# Altium footprint library SAMTEC THD.PcbLib: 161 footprints (part 5 of 12) (continued)
## SAMTEC_SMB5-J-P-H-RA-TH1 [mm] "50 Ohm SMB Right Angle PCB Jack" (continued)
3D body "SAMTEC_SMB5-J-P-H-RA-TH1_Washer.stp": height 8.4, standoff 0.6, extent 9.105,-3.897 10.205,3.897
3D body "SAMTEC_SMB5-J-P-H-RA-TH1_Nut.stp": height 8.17, standoff 0.83, extent 10.205,-3.175 11.705,3.175
3D body "SAMTEC_SMB5-J-P-H-RA-TH1.stp": height 8.13, standoff -2.79, extent -3.68,-3.215 16.77,3.215

## SAMTEC_SQT-110-01-L-D-RA [mm] "20 Contacts - Pitch 2mm - Dual Row Right Angle Socket"
height 4
pads (20):
  round 1.4 hole 0.9: 1(9,-1) 2(9,1) 3(7,-1) 4(7,1) 5(5,-1) 6(5,1) 7(3,-1) 8(3,1) 9(1,-1) 10(1,1) 11(-1,-1) 12(-1,1) 13(-3,-1) 14(-3,1) 15(-5,-1) 16(-5,1) 17(-7,-1) 18(-7,1) 19(-9,-1) 20(-9,1)
Top Overlay:
  circle w0.3: c9.027,-2.378 r0.15
  lines w0.2: -9.25,2 -9.25,2.651 ; -8.75,2 -8.75,2.651 ; -7.25,2 -7.25,2.651 ; -6.75,2 -6.75,2.651 ; -5.25,2 -5.25,2.651 ; -4.75,2 -4.75,2.651 ; -3.25,2 -3.25,2.651 ; -2.75,2 -2.75,2.651 ; -1.25,2 -1.25,2.651 ; -0.75,2 -0.75,2.651 ; 0.75,2 0.75,2.651 ; 1.25,2 1.25,2.651 ; 2.75,2 2.75,2.651 ; 3.25,2 3.25,2.651 ; 4.75,2 4.75,2.651 ; 5.25,2 5.25,2.651 ; 6.75,2 6.75,2.651 ; 7.25,2 7.25,2.651 ; 8.75,2 8.75,2.651 ; 9.25,2 9.25,2.651 ; -10.15,2.27 -10.15,8.62 10.15,8.62 10.15,2.27 9.492,2.27 9.492,2.651 8.508,2.651 8.508,2.27 7.492,2.27 7.492,2.651 6.508,2.651 6.508,2.27 5.492,2.27 5.492,2.651 4.508,2.651 4.508,2.27 3.492,2.27 3.492,2.651 2.508,2.651 2.508,2.27 1.492,2.27 1.492,2.651 0.508,2.651 0.508,2.27 -0.508,2.27 -0.508,2.651 -1.492,2.651 -1.492,2.27 -2.508,2.27 -2.508,2.651 -3.492,2.651 -3.492,2.27 -4.508,2.27 -4.508,2.651 -5.492,2.651 -5.492,2.27 -6.508,2.27 -6.508,2.651 -7.492,2.651 -7.492,2.27 -8.508,2.27 -8.508,2.651 -9.492,2.651 -9.492,2.27 -10.15,2.27
  text "20" at -9.6,3.275 h1.2
  text "1" at 10.3,-1.4 h1.2
Mechanical 8:
  lines w0.1: -9.5,-1 -9,-1 ; -9.5,1 -9,1 ; -9,-1.5 -9,-1 ; -9,-0.5 -9,-1 ; -9,0.5 -9,1 ; -9,1.5 -9,1 ; -8.5,-1 -9,-1 ; -8.5,1 -9,1 ; -7.5,-1 -7,-1 ; -7.5,1 -7,1 ; -7,-1.5 -7,-1 ; -7,-0.5 -7,-1 ; -7,0.5 -7,1 ; -7,1.5 -7,1 ; -6.5,-1 -7,-1 ; -6.5,1 -7,1 ; -5.5,-1 -5,-1 ; -5.5,1 -5,1 ; -5,-1.5 -5,-1 ; -5,-0.5 -5,-1 ; -5,0.5 -5,1 ; -5,1.5 -5,1 ; -4.5,-1 -5,-1 ; -4.5,1 -5,1 ; -3.5,-1 -3,-1 ; -3.5,1 -3,1 ; -3,-1.5 -3,-1 ; -3,-0.5 -3,-1 ; -3,0.5 -3,1 ; -3,1.5 -3,1 ; -2.5,-1 -3,-1 ; -2.5,1 -3,1 ; -1.5,-1 -1,-1 ; -1.5,1 -1,1 ; -1,-1.5 -1,-1 ; -1,-0.5 -1,-1 ; -1,0.5 -1,1 ; -1,1.5 -1,1 ; -0.5,-1 -1,-1 ; -0.5,0 0,0 ; -0.5,1 -1,1 ; 0,-0.5 0,0 ; 0,0.5 0,0 ; 0.5,-1 1,-1 ; 0.5,0 0,0 ; 0.5,1 1,1 ; 1,-1.5 1,-1 ; 1,-0.5 1,-1 ; 1,0.5 1,1 ; 1,1.5 1,1 ; 1.5,-1 1,-1 ; 1.5,1 1,1 ; 2.5,-1 3,-1 ; 2.5,1 3,1 ; 3,-1.5 3,-1 ; 3,-0.5 3,-1 ; 3,0.5 3,1 ; 3,1.5 3,1 ; 3.5,-1 3,-1 ; 3.5,1 3,1 ; 4.5,-1 5,-1 ; 4.5,1 5,1 ; 5,-1.5 5,-1 ; 5,-0.5 5,-1 ; 5,0.5 5,1 ; 5,1.5 5,1 ; 5.5,-1 5,-1 ; 5.5,1 5,1 ; 6.5,-1 7,-1 ; 6.5,1 7,1 ; 7,-1.5 7,-1 ; 7,-0.5 7,-1 ; 7,0.5 7,1 ; 7,1.5 7,1 ; 7.5,-1 7,-1 ; 7.5,1 7,1 ; 8.5,-1 9,-1 ; 8.5,1 9,1 ; 9,-1.5 9,-1 ; 9,-0.5 9,-1 ; 9,0.5 9,1 ; 9,1.5 9,1 ; 9.5,-1 9,-1 ; 9.5,1 9,1
Mechanical 14:
  circle w0.3: c9.027,-2.378 r0.15
  lines w0.1: -9.25,2.651 -9.25,-1.218 -8.75,-1.219 -8.75,2.651 ; -7.25,2.651 -7.25,-1.22 -6.75,-1.22 -6.75,2.651 ; -5.25,2.651 -5.25,-1.221 -4.75,-1.221 -4.75,2.651 ; -3.25,2.651 -3.25,-1.222 -2.75,-1.223 -2.75,2.651 ; -1.25,2.651 -1.25,-1.224 -0.75,-1.224 -0.75,2.651 ; 0.75,2.651 0.75,-1.225 1.25,-1.225 1.25,2.651 ; 2.75,2.651 2.75,-1.226 3.25,-1.227 3.25,2.651 ; 4.75,2.651 4.75,-1.228 5.25,-1.228 5.25,2.651 ; 6.75,2.651 6.75,-1.229 7.25,-1.229 7.25,2.651 ; 8.75,2.651 8.75,-1.23 9.25,-1.23 9.25,2.651 ; -10.15,2.27 -10.15,8.62 10.15,8.62 10.15,2.27 9.492,2.27 9.492,2.651 8.508,2.651 8.508,2.27 7.492,2.27 7.492,2.651 6.508,2.651 6.508,2.27 5.492,2.27 5.492,2.651 4.508,2.651 4.508,2.27 3.492,2.27 3.492,2.651 2.508,2.651 2.508,2.27 1.492,2.27 1.492,2.651 0.508,2.651 0.508,2.27 -0.508,2.27 -0.508,2.651 -1.492,2.651 -1.492,2.27 -2.508,2.27 -2.508,2.651 -3.492,2.651 -3.492,2.27 -4.508,2.27 -4.508,2.651 -5.492,2.651 -5.492,2.27 -6.508,2.27 -6.508,2.651 -7.492,2.651 -7.492,2.27 -8.508,2.27 -8.508,2.651 -9.492,2.651 -9.492,2.27 -10.15,2.27
  text "20" at -9.6,3.275 h1.2
  text "1" at 10.3,-1.4 h1.2
3D body "SAMTEC_SQT-110-01-L-D-RA.stp": height 4, standoff -2.29, extent -10.149,-1.25 10.151,8.62

## SAMTEC_SQT-112-01-L-D-RA [mm] "24 Contacts - Pitch 2mm - Dual Row Right Angle Socket"
height 4
pads (24):
  round 1.4 hole 0.9: 1(11,-1) 2(11,1) 3(9,-1) 4(9,1) 5(7,-1) 6(7,1) 7(5,-1) 8(5,1) 9(3,-1) 10(3,1) 11(1,-1) 12(1,1) 13(-1,-1) 14(-1,1) 15(-3,-1) 16(-3,1) 17(-5,-1) 18(-5,1) 19(-7,-1) 20(-7,1) 21(-9,-1) 22(-9,1) 23(-11,-1) 24(-11,1)
Top Overlay:
  circle w0.3: c11.027,-2.378 r0.15
  lines w0.2: -11.25,2 -11.25,2.651 ; -10.75,2 -10.75,2.651 ; -9.25,2 -9.25,2.651 ; -8.75,2 -8.75,2.651 ; -7.25,2 -7.25,2.651 ; -6.75,2 -6.75,2.651 ; -5.25,2 -5.25,2.651 ; -4.75,2 -4.75,2.651 ; -3.25,2 -3.25,2.651 ; -2.75,2 -2.75,2.651 ; -1.25,2 -1.25,2.651 ; -0.75,2 -0.75,2.651 ; 0.75,2 0.75,2.651 ; 1.25,2 1.25,2.651 ; 2.75,2 2.75,2.651 ; 3.25,2 3.25,2.651 ; 4.75,2 4.75,2.651 ; 5.25,2 5.25,2.651 ; 6.75,2 6.75,2.651 ; 7.25,2 7.25,2.651 ; 8.75,2 8.75,2.651 ; 9.25,2 9.25,2.651 ; 10.75,2 10.75,2.651 ; 11.25,2 11.25,2.651 ; -12.15,2.27 -11.492,2.27 -11.492,2.651 -10.508,2.651 -10.508,2.27 -9.492,2.27 -9.492,2.651 -8.508,2.651 -8.508,2.27 -7.492,2.27 -7.492,2.651 -6.508,2.651 -6.508,2.27 -5.492,2.27 -5.492,2.651 -4.508,2.651 -4.508,2.27 -3.492,2.27 -3.492,2.651 -2.508,2.651 -2.508,2.27 -1.492,2.27 -1.492,2.651 -0.508,2.651 -0.508,2.27 0.508,2.27 0.508,2.651 1.492,2.651 1.492,2.27 2.508,2.27 2.508,2.651 3.492,2.651 3.492,2.27 4.508,2.27 4.508,2.651 5.492,2.651 5.492,2.27 6.508,2.27 6.508,2.651 7.492,2.651 7.492,2.27 8.508,2.27 8.508,2.651 9.492,2.651 9.492,2.27 10.508,2.27 10.508,2.651 11.492,2.651 11.492,2.27 12.15,2.27 12.15,8.62 -12.15,8.62 -12.15,2.27
  text "24" at -11.675,3.225 h1.2
  text "1" at 12.3,-1.4 h1.2
Mechanical 8:
  lines w0.1: -11.5,-1 -11,-1 ; -11.5,1 -11,1 ; -11,-1.5 -11,-1 ; -11,-0.5 -11,-1 ; -11,0.5 -11,1 ; -11,1.5 -11,1 ; -10.5,-1 -11,-1 ; -10.5,1 -11,1 ; -9.5,-1 -9,-1 ; -9.5,1 -9,1 ; -9,-1.5 -9,-1 ; -9,-0.5 -9,-1 ; -9,0.5 -9,1 ; -9,1.5 -9,1 ; -8.5,-1 -9,-1 ; -8.5,1 -9,1 ; -7.5,-1 -7,-1 ; -7.5,1 -7,1 ; -7,-1.5 -7,-1 ; -7,-0.5 -7,-1 ; -7,0.5 -7,1 ; -7,1.5 -7,1 ; -6.5,-1 -7,-1 ; -6.5,1 -7,1 ; -5.5,-1 -5,-1 ; -5.5,1 -5,1 ; -5,-1.5 -5,-1 ; -5,-0.5 -5,-1 ; -5,0.5 -5,1 ; -5,1.5 -5,1 ; -4.5,-1 -5,-1 ; -4.5,1 -5,1 ; -3.5,-1 -3,-1 ; -3.5,1 -3,1 ; -3,-1.5 -3,-1 ; -3,-0.5 -3,-1 ; -3,0.5 -3,1 ; -3,1.5 -3,1 ; -2.5,-1 -3,-1 ; -2.5,1 -3,1 ; -1.5,-1 -1,-1 ; -1.5,1 -1,1 ; -1,-1.5 -1,-1 ; -1,-0.5 -1,-1 ; -1,0.5 -1,1 ; -1,1.5 -1,1 ; -0.5,-1 -1,-1 ; -0.5,0 0,0 ; -0.5,1 -1,1 ; 0,-0.5 0,0 ; 0,0.5 0,0 ; 0.5,-1 1,-1 ; 0.5,0 0,0 ; 0.5,1 1,1 ; 1,-1.5 1,-1 ; 1,-0.5 1,-1 ; 1,0.5 1,1 ; 1,1.5 1,1 ; 1.5,-1 1,-1 ; 1.5,1 1,1 ; 2.5,-1 3,-1 ; 2.5,1 3,1 ; 3,-1.5 3,-1 ; 3,-0.5 3,-1 ; 3,0.5 3,1 ; 3,1.5 3,1 ; 3.5,-1 3,-1 ; 3.5,1 3,1 ; 4.5,-1 5,-1 ; 4.5,1 5,1 ; 5,-1.5 5,-1 ; 5,-0.5 5,-1 ; 5,0.5 5,1 ; 5,1.5 5,1 ; 5.5,-1 5,-1 ; 5.5,1 5,1 ; 6.5,-1 7,-1 ; 6.5,1 7,1 ; 7,-1.5 7,-1 ; 7,-0.5 7,-1 ; 7,0.5 7,1 ; 7,1.5 7,1 ; 7.5,-1 7,-1 ; 7.5,1 7,1 ; 8.5,-1 9,-1 ; 8.5,1 9,1 ; 9,-1.5 9,-1 ; 9,-0.5 9,-1 ; 9,0.5 9,1 ; 9,1.5 9,1 ; 9.5,-1 9,-1 ; 9.5,1 9,1 ; 10.5,-1 11,-1 ; 10.5,1 11,1 ; 11,-1.5 11,-1 ; 11,-0.5 11,-1 ; 11,0.5 11,1 ; 11,1.5 11,1 ; 11.5,-1 11,-1 ; 11.5,1 11,1
Mechanical 14:
  circle w0.3: c11.027,-2.378 r0.15
  lines w0.1: -11.25,2.651 -11.25,-1.218 -10.75,-1.219 -10.75,2.651 ; -9.25,2.651 -9.25,-1.22 -8.75,-1.22 -8.75,2.651 ; -7.25,2.651 -7.25,-1.221 -6.75,-1.221 -6.75,2.651 ; -5.25,2.651 -5.25,-1.222 -4.75,-1.223 -4.75,2.651 ; -3.25,2.651 -3.25,-1.224 -2.75,-1.224 -2.75,2.651 ; -1.25,2.651 -1.25,-1.225 -0.75,-1.225 -0.75,2.651 ; 0.75,2.651 0.75,-1.226 1.25,-1.227 1.25,2.651 ; 2.75,2.651 2.75,-1.228 3.25,-1.228 3.25,2.651 ; 4.75,2.651 4.75,-1.229 5.25,-1.229 5.25,2.651 ; 6.75,2.651 6.75,-1.23 7.25,-1.23 7.25,2.651 ; 8.75,2.651 8.75,-1.23 9.25,-1.23 9.25,2.651 ; 10.75,2.651 10.75,-1.23 11.25,-1.23 11.25,2.651 ; -12.15,2.27 -11.492,2.27 -11.492,2.651 -10.508,2.651 -10.508,2.27 -9.492,2.27 -9.492,2.651 -8.508,2.651 -8.508,2.27 -7.492,2.27 -7.492,2.651 -6.508,2.651 -6.508,2.27 -5.492,2.27 -5.492,2.651 -4.508,2.651 -4.508,2.27 -3.492,2.27 -3.492,2.651 -2.508,2.651 -2.508,2.27 -1.492,2.27 -1.492,2.651 -0.508,2.651 -0.508,2.27 0.508,2.27 0.508,2.651 1.492,2.651 1.492,2.27 2.508,2.27 2.508,2.651 3.492,2.651 3.492,2.27 4.508,2.27 4.508,2.651 5.492,2.651 5.492,2.27 6.508,2.27 6.508,2.651 7.492,2.651 7.492,2.27 8.508,2.27 8.508,2.651 9.492,2.651 9.492,2.27 10.508,2.27 10.508,2.651 11.492,2.651 11.492,2.27 12.15,2.27 12.15,8.62 -12.15,8.62 -12.15,2.27
  text "24" at -11.675,3.225 h1.2
  text "1" at 12.3,-1.4 h1.2
3D body "SAMTEC_SQT-112-01-L-D-RA.stp": height 4, standoff -2.29, extent -12.15,-1.25 12.15,8.62

## SAMTEC_SQT-113-01-L-D-RA [mm] "26 Contacts - Pitch 2mm - Dual Row Right Angle Socket"
height 4
pads (26):
  round 1.4 hole 0.9: 1(12,-1) 2(12,1) 3(10,-1) 4(10,1) 5(8,-1) 6(8,1) 7(6,-1) 8(6,1) 9(4,-1) 10(4,1) 11(2,-1) 12(2,1) 13(0,-1) 14(0,1) 15(-2,-1) 16(-2,1) 17(-4,-1) 18(-4,1) 19(-6,-1) 20(-6,1) 21(-8,-1) 22(-8,1) 23(-10,-1) 24(-10,1) 25(-12,-1) 26(-12,1)
Top Overlay:
  circle w0.3: c12.027,-2.378 r0.15
  lines w0.2: -12.25,2 -12.25,2.651 ; -11.75,2 -11.75,2.651 ; -10.25,2 -10.25,2.651 ; -9.75,2 -9.75,2.651 ; -8.25,2 -8.25,2.651 ; -7.75,2 -7.75,2.651 ; -6.25,2 -6.25,2.651 ; -5.75,2 -5.75,2.651 ; -4.25,2 -4.25,2.651 ; -3.75,2 -3.75,2.651 ; -2.25,2 -2.25,2.651 ; -1.75,2 -1.75,2.651 ; -0.25,2 -0.25,2.651 ; 0.25,2 0.25,2.651 ; 1.75,2 1.75,2.651 ; 2.25,2 2.25,2.651 ; 3.75,2 3.75,2.651 ; 4.25,2 4.25,2.651 ; 5.75,2 5.75,2.651 ; 6.25,2 6.25,2.651 ; 7.75,2 7.75,2.651 ; 8.25,2 8.25,2.651 ; 9.75,2 9.75,2.651 ; 10.25,2 10.25,2.651 ; 11.75,2 11.75,2.651 ; 12.25,2 12.25,2.651 ; -13.15,2.27 -13.15,8.62 13.15,8.62 13.15,2.27 12.492,2.27 12.492,2.651 11.508,2.651 11.508,2.27 10.492,2.27 10.492,2.651 9.508,2.651 9.508,2.27 8.492,2.27 8.492,2.651 7.508,2.651 7.508,2.27 6.492,2.27 6.492,2.651 5.508,2.651 5.508,2.27 4.492,2.27 4.492,2.651 3.508,2.651 3.508,2.27 2.492,2.27 2.492,2.651 1.508,2.651 1.508,2.27 0.492,2.27 0.492,2.651 -0.492,2.651 -0.492,2.27 -1.508,2.27 -1.508,2.651 -2.492,2.651 -2.492,2.27 -3.508,2.27 -3.508,2.651 -4.492,2.651 -4.492,2.27 -5.508,2.27 -5.508,2.651 -6.492,2.651 -6.492,2.27 -7.508,2.27 -7.508,2.651 -8.492,2.651 -8.492,2.27 -9.508,2.27 -9.508,2.651 -10.492,2.651 -10.492,2.27 -11.508,2.27 -11.508,2.651 -12.492,2.651 -12.492,2.27 -13.15,2.27
  text "26" at -12.6,3.225 h1.2
  text "1" at 13.3,-1.4 h1.2
Mechanical 8:
  lines w0.1: -12.5,-1 -12,-1 ; -12.5,1 -12,1 ; -12,-1.5 -12,-1 ; -12,-0.5 -12,-1 ; -12,0.5 -12,1 ; -12,1.5 -12,1 ; -11.5,-1 -12,-1 ; -11.5,1 -12,1 ; -10.5,-1 -10,-1 ; -10.5,1 -10,1 ; -10,-1.5 -10,-1 ; -10,-0.5 -10,-1 ; -10,0.5 -10,1 ; -10,1.5 -10,1 ; -9.5,-1 -10,-1 ; -9.5,1 -10,1 ; -8.5,-1 -8,-1 ; -8.5,1 -8,1 ; -8,-1.5 -8,-1 ; -8,-0.5 -8,-1 ; -8,0.5 -8,1 ; -8,1.5 -8,1 ; -7.5,-1 -8,-1 ; -7.5,1 -8,1 ; -6.5,-1 -6,-1 ; -6.5,1 -6,1 ; -6,-1.5 -6,-1 ; -6,-0.5 -6,-1 ; -6,0.5 -6,1 ; -6,1.5 -6,1 ; -5.5,-1 -6,-1 ; -5.5,1 -6,1 ; -4.5,-1 -4,-1 ; -4.5,1 -4,1 ; -4,-1.5 -4,-1 ; -4,-0.5 -4,-1 ; -4,0.5 -4,1 ; -4,1.5 -4,1 ; -3.5,-1 -4,-1 ; -3.5,1 -4,1 ; -2.5,-1 -2,-1 ; -2.5,1 -2,1 ; -2,-1.5 -2,-1 ; -2,-0.5 -2,-1 ; -2,0.5 -2,1 ; -2,1.5 -2,1 ; -1.5,-1 -2,-1 ; -1.5,1 -2,1 ; -0.5,-1 0,-1 ; -0.5,0 0,0 ; -0.5,1 0,1 ; 0,-1.5 0,-1 ; 0,1.5 0,1 ; 0.5,-1 0,-1 ; 0.5,0 0,0 ; 0.5,1 0,1 ; 1.5,-1 2,-1 ; 1.5,1 2,1 ; 2,-1.5 2,-1 ; 2,-0.5 2,-1 ; 2,0.5 2,1 ; 2,1.5 2,1 ; 2.5,-1 2,-1 ; 2.5,1 2,1 ; 3.5,-1 4,-1 ; 3.5,1 4,1 ; 4,-1.5 4,-1 ; 4,-0.5 4,-1 ; 4,0.5 4,1 ; 4,1.5 4,1 ; 4.5,-1 4,-1 ; 4.5,1 4,1 ; 5.5,-1 6,-1 ; 5.5,1 6,1 ; 6,-1.5 6,-1 ; 6,-0.5 6,-1 ; 6,0.5 6,1 ; 6,1.5 6,1 ; 6.5,-1 6,-1 ; 6.5,1 6,1 ; 7.5,-1 8,-1 ; 7.5,1 8,1 ; 8,-1.5 8,-1 ; 8,-0.5 8,-1 ; 8,0.5 8,1 ; 8,1.5 8,1 ; 8.5,-1 8,-1 ; 8.5,1 8,1 ; 9.5,-1 10,-1 ; 9.5,1 10,1 ; 10,-1.5 10,-1 ; 10,-0.5 10,-1 ; 10,0.5 10,1 ; 10,1.5 10,1 ; 10.5,-1 10,-1 ; 10.5,1 10,1 ; 11.5,-1 12,-1 ; 11.5,1 12,1 ; 12,-1.5 12,-1 ; 12,-0.5 12,-1 ; 12,0.5 12,1 ; 12,1.5 12,1 ; 12.5,-1 12,-1 ; 12.5,1 12,1 ; 0,-1 0,-0.5 0,0 ; 0,0 0,0.5 0,1
Mechanical 14:
  circle w0.3: c12.027,-2.378 r0.15
  lines w0.1: -12.25,2.651 -12.25,-1.218 -11.75,-1.219 -11.75,2.651 ; -10.25,2.651 -10.25,-1.22 -9.75,-1.22 -9.75,2.651 ; -8.25,2.651 -8.25,-1.221 -7.75,-1.221 -7.75,2.651 ; -6.25,2.651 -6.25,-1.222 -5.75,-1.223 -5.75,2.651 ; -4.25,2.651 -4.25,-1.224 -3.75,-1.224 -3.75,2.651 ; -2.25,2.651 -2.25,-1.225 -1.75,-1.225 -1.75,2.651 ; -0.25,2.651 -0.25,-1.226 0.25,-1.227 0.25,2.651 ; 1.75,2.651 1.75,-1.228 2.25,-1.228 2.25,2.651 ; 3.75,2.651 3.75,-1.229 4.25,-1.229 4.25,2.651 ; 5.75,2.651 5.75,-1.23 6.25,-1.23 6.25,2.651 ; 7.75,2.651 7.75,-1.231 8.25,-1.232 8.25,2.651 ; 9.75,2.651 9.75,-1.233 10.25,-1.233 10.25,2.651 ; 11.75,2.651 11.75,-1.234 12.25,-1.234 12.25,2.651 ; -13.15,2.27 -13.15,8.62 13.15,8.62 13.15,2.27 12.492,2.27 12.492,2.651 11.508,2.651 11.508,2.27 10.492,2.27 10.492,2.651 9.508,2.651 9.508,2.27 8.492,2.27 8.492,2.651 7.508,2.651 7.508,2.27 6.492,2.27 6.492,2.651 5.508,2.651 5.508,2.27 4.492,2.27 4.492,2.651 3.508,2.651 3.508,2.27 2.492,2.27 2.492,2.651 1.508,2.651 1.508,2.27 0.492,2.27 0.492,2.651 -0.492,2.651 -0.492,2.27 -1.508,2.27 -1.508,2.651 -2.492,2.651 -2.492,2.27 -3.508,2.27 -3.508,2.651 -4.492,2.651 -4.492,2.27 -5.508,2.27 -5.508,2.651 -6.492,2.651 -6.492,2.27 -7.508,2.27 -7.508,2.651 -8.492,2.651 -8.492,2.27 -9.508,2.27 -9.508,2.651 -10.492,2.651 -10.492,2.27 -11.508,2.27 -11.508,2.651 -12.492,2.651 -12.492,2.27 -13.15,2.27
  text "26" at -12.6,3.225 h1.2
  text "1" at 13.3,-1.4 h1.2
3D body "SAMTEC_SQT-113-01-L-D-RA.stp": height 4, standoff -2.29, extent -13.15,-1.25 13.15,8.62

## SAMTEC_SQT-115-01-L-D-RA [mm] "30 Contacts - Pitch 2mm - Dual Row Right Angle Socket"
height 4
pads (30):
  round 1.4 hole 0.9: 1(14,-1) 2(14,1) 3(12,-1) 4(12,1) 5(10,-1) 6(10,1) 7(8,-1) 8(8,1) 9(6,-1) 10(6,1) 11(4,-1) 12(4,1) 13(2,-1) 14(2,1) 15(0,-1) 16(0,1) 17(-2,-1) 18(-2,1) 19(-4,-1) 20(-4,1) 21(-6,-1) 22(-6,1) 23(-8,-1) 24(-8,1) 25(-10,-1) 26(-10,1) 27(-12,-1) 28(-12,1) 29(-14,-1) 30(-14,1)
Top Overlay:
  circle w0.3: c14.027,-2.378 r0.15
  lines w0.2: -14.25,2 -14.25,2.651 ; -13.75,2 -13.75,2.651 ; -12.25,2 -12.25,2.651 ; -11.75,2 -11.75,2.651 ; -10.25,2 -10.25,2.651 ; -9.75,2 -9.75,2.651 ; -8.25,2 -8.25,2.651 ; -7.75,2 -7.75,2.651 ; -6.25,2 -6.25,2.651 ; -5.75,2 -5.75,2.651 ; -4.25,2 -4.25,2.651 ; -3.75,2 -3.75,2.651 ; -2.25,2 -2.25,2.651 ; -1.75,2 -1.75,2.651 ; -0.25,2 -0.25,2.651 ; 0.25,2 0.25,2.651 ; 1.75,2 1.75,2.651 ; 2.25,2 2.25,2.651 ; 3.75,2 3.75,2.651 ; 4.25,2 4.25,2.651 ; 5.75,2 5.75,2.651 ; 6.25,2 6.25,2.651 ; 7.75,2 7.75,2.651 ; 8.25,2 8.25,2.651 ; 9.75,2 9.75,2.651 ; 10.25,2 10.25,2.651 ; 11.75,2 11.75,2.651 ; 12.25,2 12.25,2.651 ; 13.75,2 13.75,2.651 ; 14.25,2 14.25,2.651 ; -15.15,2.27 -14.492,2.27 -14.492,2.651 -13.508,2.651 -13.508,2.27 -12.492,2.27 -12.492,2.651 -11.508,2.651 -11.508,2.27 -10.492,2.27 -10.492,2.651 -9.508,2.651 -9.508,2.27 -8.492,2.27 -8.492,2.651 -7.508,2.651 -7.508,2.27 -6.492,2.27 -6.492,2.651 -5.508,2.651 -5.508,2.27 -4.492,2.27 -4.492,2.651 -3.508,2.651 -3.508,2.27 -2.492,2.27 -2.492,2.651 -1.508,2.651 -1.508,2.27 -0.492,2.27 -0.492,2.651 0.492,2.651 0.492,2.27 1.508,2.27 1.508,2.651 2.492,2.651 2.492,2.27 3.508,2.27 3.508,2.651 4.492,2.651 4.492,2.27 5.508,2.27 5.508,2.651 6.492,2.651 6.492,2.27 7.508,2.27 7.508,2.651 8.492,2.651 8.492,2.27 9.508,2.27 9.508,2.651 10.492,2.651 10.492,2.27 11.508,2.27 11.508,2.651 12.492,2.651 12.492,2.27 13.508,2.27 13.508,2.651 14.492,2.651 14.492,2.27 15.15,2.27 15.15,8.62 -15.15,8.62 -15.15,2.27
  text "1" at 15.3,-1.4 h1.2
  text "30" at -14.6,3.225 h1.2
Mechanical 8:
  lines w0.1: -14.5,-1 -14,-1 ; -14.5,1 -14,1 ; -14,-1.5 -14,-1 ; -14,-0.5 -14,-1 ; -14,0.5 -14,1 ; -14,1.5 -14,1 ; -13.5,-1 -14,-1 ; -13.5,1 -14,1 ; -12.5,-1 -12,-1 ; -12.5,1 -12,1 ; -12,-1.5 -12,-1 ; -12,-0.5 -12,-1 ; -12,0.5 -12,1 ; -12,1.5 -12,1 ; -11.5,-1 -12,-1 ; -11.5,1 -12,1 ; -10.5,-1 -10,-1 ; -10.5,1 -10,1 ; -10,-1.5 -10,-1 ; -10,-0.5 -10,-1 ; -10,0.5 -10,1 ; -10,1.5 -10,1 ; -9.5,-1 -10,-1 ; -9.5,1 -10,1 ; -8.5,-1 -8,-1 ; -8.5,1 -8,1 ; -8,-1.5 -8,-1 ; -8,-0.5 -8,-1 ; -8,0.5 -8,1 ; -8,1.5 -8,1 ; -7.5,-1 -8,-1 ; -7.5,1 -8,1 ; -6.5,-1 -6,-1 ; -6.5,1 -6,1 ; -6,-1.5 -6,-1 ; -6,-0.5 -6,-1 ; -6,0.5 -6,1 ; -6,1.5 -6,1 ; -5.5,-1 -6,-1 ; -5.5,1 -6,1 ; -4.5,-1 -4,-1 ; -4.5,1 -4,1 ; -4,-1.5 -4,-1 ; -4,-0.5 -4,-1 ; -4,0.5 -4,1 ; -4,1.5 -4,1 ; -3.5,-1 -4,-1 ; -3.5,1 -4,1 ; -2.5,-1 -2,-1 ; -2.5,1 -2,1 ; -2,-1.5 -2,-1 ; -2,-0.5 -2,-1 ; -2,0.5 -2,1 ; -2,1.5 -2,1 ; -1.5,-1 -2,-1 ; -1.5,1 -2,1 ; -0.5,-1 0,-1 ; -0.5,0 0,0 ; -0.5,1 0,1 ; 0,-1.5 0,-1 ; 0,1.5 0,1 ; 0.5,-1 0,-1 ; 0.5,0 0,0 ; 0.5,1 0,1 ; 1.5,-1 2,-1 ; 1.5,1 2,1 ; 2,-1.5 2,-1 ; 2,-0.5 2,-1 ; 2,0.5 2,1 ; 2,1.5 2,1 ; 2.5,-1 2,-1 ; 2.5,1 2,1 ; 3.5,-1 4,-1 ; 3.5,1 4,1 ; 4,-1.5 4,-1 ; 4,-0.5 4,-1 ; 4,0.5 4,1 ; 4,1.5 4,1 ; 4.5,-1 4,-1 ; 4.5,1 4,1 ; 5.5,-1 6,-1 ; 5.5,1 6,1 ; 6,-1.5 6,-1 ; 6,-0.5 6,-1 ; 6,0.5 6,1 ; 6,1.5 6,1 ; 6.5,-1 6,-1 ; 6.5,1 6,1 ; 7.5,-1 8,-1 ; 7.5,1 8,1 ; 8,-1.5 8,-1 ; 8,-0.5 8,-1 ; 8,0.5 8,1 ; 8,1.5 8,1 ; 8.5,-1 8,-1 ; 8.5,1 8,1 ; 9.5,-1 10,-1 ; 9.5,1 10,1 ; 10,-1.5 10,-1 ; 10,-0.5 10,-1 ; 10,0.5 10,1 ; 10,1.5 10,1 ; 10.5,-1 10,-1 ; 10.5,1 10,1 ; 11.5,-1 12,-1 ; 11.5,1 12,1 ; 12,-1.5 12,-1 ; 12,-0.5 12,-1 ; 12,0.5 12,1 ; 12,1.5 12,1 ; 12.5,-1 12,-1 ; 12.5,1 12,1 ; 13.5,-1 14,-1 ; 13.5,1 14,1 ; 14,-1.5 14,-1 ; 14,-0.5 14,-1 ; 14,0.5 14,1 ; 14,1.5 14,1 ; 14.5,-1 14,-1 ; 14.5,1 14,1 ; 0,-1 0,-0.5 0,0 ; 0,0 0,0.5 0,1
Mechanical 14:
  circle w0.3: c14.027,-2.378 r0.15
  lines w0.1: -14.25,2.651 -14.25,-1.218 -13.75,-1.219 -13.75,2.651 ; -12.25,2.651 -12.25,-1.22 -11.75,-1.22 -11.75,2.651 ; -10.25,2.651 -10.25,-1.22 -9.75,-1.22 -9.75,2.651 ; -8.25,2.651 -8.25,-1.22 -7.75,-1.22 -7.75,2.651 ; -6.25,2.651 -6.25,-1.221 -5.75,-1.221 -5.75,2.651 ; -4.25,2.651 -4.25,-1.222 -3.75,-1.223 -3.75,2.651 ; -2.25,2.651 -2.25,-1.224 -1.75,-1.224 -1.75,2.651 ; -0.25,2.651 -0.25,-1.225 0.25,-1.225 0.25,2.651 ; 1.75,2.651 1.75,-1.226 2.25,-1.227 2.25,2.651 ; 3.75,2.651 3.75,-1.228 4.25,-1.228 4.25,2.651 ; 5.75,2.651 5.75,-1.229 6.25,-1.229 6.25,2.651 ; 7.75,2.651 7.75,-1.23 8.25,-1.23 8.25,2.651 ; 9.75,2.651 9.75,-1.231 10.25,-1.232 10.25,2.651 ; 11.75,2.651 11.75,-1.233 12.25,-1.233 12.25,2.651 ; 13.75,2.651 13.75,-1.234 14.25,-1.234 14.25,2.651 ; -15.15,2.27 -14.492,2.27 -14.492,2.651 -13.508,2.651 -13.508,2.27 -12.492,2.27 -12.492,2.651 -11.508,2.651 -11.508,2.27 -10.492,2.27 -10.492,2.651 -9.508,2.651 -9.508,2.27 -8.492,2.27 -8.492,2.651 -7.508,2.651 -7.508,2.27 -6.492,2.27 -6.492,2.651 -5.508,2.651 -5.508,2.27 -4.492,2.27 -4.492,2.651 -3.508,2.651 -3.508,2.27 -2.492,2.27 -2.492,2.651 -1.508,2.651 -1.508,2.27 -0.492,2.27 -0.492,2.651 0.492,2.651 0.492,2.27 1.508,2.27 1.508,2.651 2.492,2.651 2.492,2.27 3.508,2.27 3.508,2.651 4.492,2.651 4.492,2.27 5.508,2.27 5.508,2.651 6.492,2.651 6.492,2.27 7.508,2.27 7.508,2.651 8.492,2.651 8.492,2.27 9.508,2.27 9.508,2.651 10.492,2.651 10.492,2.27 11.508,2.27 11.508,2.651 12.492,2.651 12.492,2.27 13.508,2.27 13.508,2.651 14.492,2.651 14.492,2.27 15.15,2.27 15.15,8.62 -15.15,8.62 -15.15,2.27
  text "1" at 15.3,-1.4 h1.2
  text "30" at -14.6,3.225 h1.2
3D body "SAMTEC_SQT-115-01-L-D-RA.stp": height 4, standoff -2.29, extent -15.15,-1.25 15.15,8.62

## SAMTEC_SQT-125-01-L-D-RA [mm] "50 Contacts - Pitch 2mm - Dual Row Right Angle Socket"
height 4
pads (50):
  round 1.4 hole 0.9: 1(24,-1) 2(24,1) 3(22,-1) 4(22,1) 5(20,-1) 6(20,1) 7(18,-1) 8(18,1) 9(16,-1) 10(16,1) 11(14,-1) 12(14,1) 13(12,-1) 14(12,1) 15(10,-1) 16(10,1) 17(8,-1) 18(8,1) 19(6,-1) 20(6,1) 21(4,-1) 22(4,1) 23(2,-1) 24(2,1) 25(0,-1) 26(0,1) 27(-2,-1) 28(-2,1) 29(-4,-1) 30(-4,1) 31(-6,-1) 32(-6,1) 33(-8,-1) 34(-8,1) 35(-10,-1) 36(-10,1) 37(-12,-1) 38(-12,1) 39(-14,-1) 40(-14,1) 41(-16,-1) 42(-16,1) 43(-18,-1) 44(-18,1) 45(-20,-1) 46(-20,1) 47(-22,-1) 48(-22,1) 49(-24,-1) 50(-24,1)
Top Overlay:
  drawing of 155 lines, arcs and shapes, not listed
  text "50" at -24.675,3.1 h1.2
  text "1" at 25.3,-1.4 h1.2
Mechanical 8:
  drawing of 204 lines, arcs and shapes, not listed
Mechanical 14:
  drawing of 180 lines, arcs and shapes, not listed
  text "50" at -24.675,3.1 h1.2
  text "1" at 25.3,-1.4 h1.2
3D body "SAMTEC_SQT-125-01-L-D-RA.stp": height 4, standoff -2.29, extent -25.15,-1.25 25.15,8.62

## SAMTEC_SS-103-G-22 [mm] "3 Contacts, Pitch 2.54mm, Single Row Through Mount Straigh Socket (Lead Length 3.18mm)"
height 4.44
pads (3):
  rect 1.5x1.5 hole 0.8: 1(0,0)
  round 1.5 hole 0.8: 2(2.54,0) 3(5.08,0)
Top Overlay:
  circle w0.3: c-0.508,1.778 r0.15
  lines w0.2: -1.27,-0.762 -1.27,0.762 -1.016,1.27 1.016,1.27 1.27,0.762 1.524,1.27 3.556,1.27 3.81,0.762 4.064,1.27 6.096,1.27 6.35,0.762 6.35,-0.762 6.096,-1.27 4.064,-1.27 3.81,-0.762 3.556,-1.27 1.524,-1.27 1.27,-0.762 1.016,-1.27 -1.016,-1.27 -1.27,-0.762
Mechanical 8:
  lines w0.1: -0.5,0 0,0 ; 0,-0.5 0,0 ; 0,0.5 0,0 ; 0.5,0 0,0 ; 2.04,0 2.54,0 ; 2.54,-0.5 2.54,0 ; 2.54,0.5 2.54,0 ; 3.04,0 2.54,0 ; 4.58,0 5.08,0 ; 5.08,-0.5 5.08,0 ; 5.08,0.5 5.08,0 ; 5.58,0 5.08,0
Mechanical 14:
  circle w0.3: c-0.508,1.778 r0.15
  circle w0.1: c0,0 r0.48
  circle w0.1: c2.54,0 r0.48
  circle w0.1: c5.08,0 r0.48
  circle w0.1: c5.08,0 r0.66
  circle w0.1: c2.54,0 r0.66
  circle w0.1: c0,0 r0.66
  lines w0.1: -1.27,-0.762 -1.27,0.762 -1.016,1.27 1.016,1.27 1.27,0.762 1.524,1.27 3.556,1.27 3.81,0.762 4.064,1.27 6.096,1.27 6.35,0.762 6.35,-0.762 6.096,-1.27 4.064,-1.27 3.81,-0.762 3.556,-1.27 1.524,-1.27 1.27,-0.762 1.016,-1.27 -1.016,-1.27 -1.27,-0.762
3D body "SAMTEC_SS-103-G-22.stp": height 4.44, standoff -3.17, extent -1.27,-1.27 6.35,1.27

## SAMTEC_SSW-102-02-G-S [mm] "2 Contacts, Pitch 2.54mm - Top Entry, Single Row, Through Mount Straigh Socket"
height 8.5
pads (2):
  rect 1.7x1.7 hole 1: 1(-1.27,0)
  round 1.7 hole 1: 2(1.27,0)
Top Overlay:
  circle w0.3: c-1.305,1.665 r0.15
  lines w0.2: -2.794,-1.206 -2.794,1.206 2.794,1.206 2.794,-1.206 -2.794,-1.206
Mechanical 8:
  lines w0.1: -1.77,0 -1.27,0 ; -1.27,-0.5 -1.27,0 ; -1.27,0.5 -1.27,0 ; -0.77,0 -1.27,0 ; -0.5,0 0,0 ; 0,-0.5 0,0 ; 0,0.5 0,0 ; 0.5,0 0,0 ; 0.77,0 1.27,0 ; 1.27,-0.5 1.27,0 ; 1.27,0.5 1.27,0 ; 1.77,0 1.27,0
Mechanical 14:
  circle w0.3: c-1.305,1.665 r0.15
  lines w0.1: -2.095,-0.826 -1.664,-0.394 ; -2.095,-0.826 -2.095,0.826 ; -2.095,-0.826 -0.445,-0.826 ; -2.095,0.826 -1.664,0.394 ; -2.095,0.826 -0.445,0.826 ; -1.664,-0.394 -1.664,0.394 ; -1.664,-0.394 -0.876,-0.394 ; -1.664,0.394 -0.876,0.394 ; -0.876,-0.394 -0.445,-0.826 ; -0.876,-0.394 -0.876,0.394 ; -0.876,0.394 -0.445,0.826 ; -0.445,-0.826 -0.445,0.826 ; 0.445,-0.826 0.876,-0.394 ; 0.445,-0.826 0.445,0.826 ; 0.445,-0.826 2.095,-0.826 ; 0.445,0.826 0.876,0.394 ; 0.445,0.826 2.095,0.826 ; 0.876,-0.394 0.876,0.394 ; 0.876,-0.394 1.664,-0.394 ; 0.876,0.394 1.664,0.394 ; 1.664,-0.394 2.095,-0.826 ; 1.664,-0.394 1.664,0.394 ; 1.664,0.394 2.095,0.826 ; 2.095,-0.826 2.095,0.826 ; -2.794,-1.206 -2.794,1.206 2.794,1.206 2.794,-1.206 -2.794,-1.206
3D body "SAMTEC_SSW-102-02-G-S.stp": height 8.51, standoff -4.93, extent -2.794,-1.206 2.794,1.207

## SAMTEC_SSW-102-02-L-S [mm] "2 Contacts, Pitch 2.54mm - Top Entry, Single Row, Through Mount Straigh Socket"
height 8.5
pads (2):
  rect 1.7x1.7 hole 1: 1(-1.27,0)
  round 1.7 hole 1: 2(1.27,0)
Top Overlay:
  circle w0.3: c-1.305,1.665 r0.15
  lines w0.2: -2.794,-1.206 -2.794,1.206 2.794,1.206 2.794,-1.206 -2.794,-1.206
Mechanical 8:
  lines w0.1: -1.77,0 -1.27,0 ; -1.27,-0.5 -1.27,0 ; -1.27,0.5 -1.27,0 ; -0.77,0 -1.27,0 ; -0.5,0 0,0 ; 0,-0.5 0,0 ; 0,0.5 0,0 ; 0.5,0 0,0 ; 0.77,0 1.27,0 ; 1.27,-0.5 1.27,0 ; 1.27,0.5 1.27,0 ; 1.77,0 1.27,0
Mechanical 14:
  circle w0.3: c-1.305,1.665 r0.15
  lines w0.1: -2.095,-0.826 -1.664,-0.394 ; -2.095,-0.826 -2.095,0.826 ; -2.095,-0.826 -0.445,-0.826 ; -2.095,0.826 -1.664,0.394 ; -2.095,0.826 -0.445,0.826 ; -1.664,-0.394 -1.664,0.394 ; -1.664,-0.394 -0.876,-0.394 ; -1.664,0.394 -0.876,0.394 ; -0.876,-0.394 -0.445,-0.826 ; -0.876,-0.394 -0.876,0.394 ; -0.876,0.394 -0.445,0.826 ; -0.445,-0.826 -0.445,0.826 ; 0.445,-0.826 0.876,-0.394 ; 0.445,-0.826 0.445,0.826 ; 0.445,-0.826 2.095,-0.826 ; 0.445,0.826 0.876,0.394 ; 0.445,0.826 2.095,0.826 ; 0.876,-0.394 0.876,0.394 ; 0.876,-0.394 1.664,-0.394 ; 0.876,0.394 1.664,0.394 ; 1.664,-0.394 2.095,-0.826 ; 1.664,-0.394 1.664,0.394 ; 1.664,0.394 2.095,0.826 ; 2.095,-0.826 2.095,0.826 ; -2.794,-1.206 -2.794,1.206 2.794,1.206 2.794,-1.206 -2.794,-1.206
3D body "SAMTEC_SSW-102-02-L-S.stp": height 8.51, standoff -4.93, extent -2.794,-1.206 2.794,1.207